# Altium footprint library con-amp.PCBLIB: 295 footprints (part 6 of 19)
Each footprint in its own frame and in the unit in brackets; x right, y up, seen from the top. Pads: shape width x height; smd on the part's side, far side on the other; paste and mask are expansions set on the pad; w line width, h text height; cw(c..) or ccw(c..) is an arc to the next point about the centre after c.
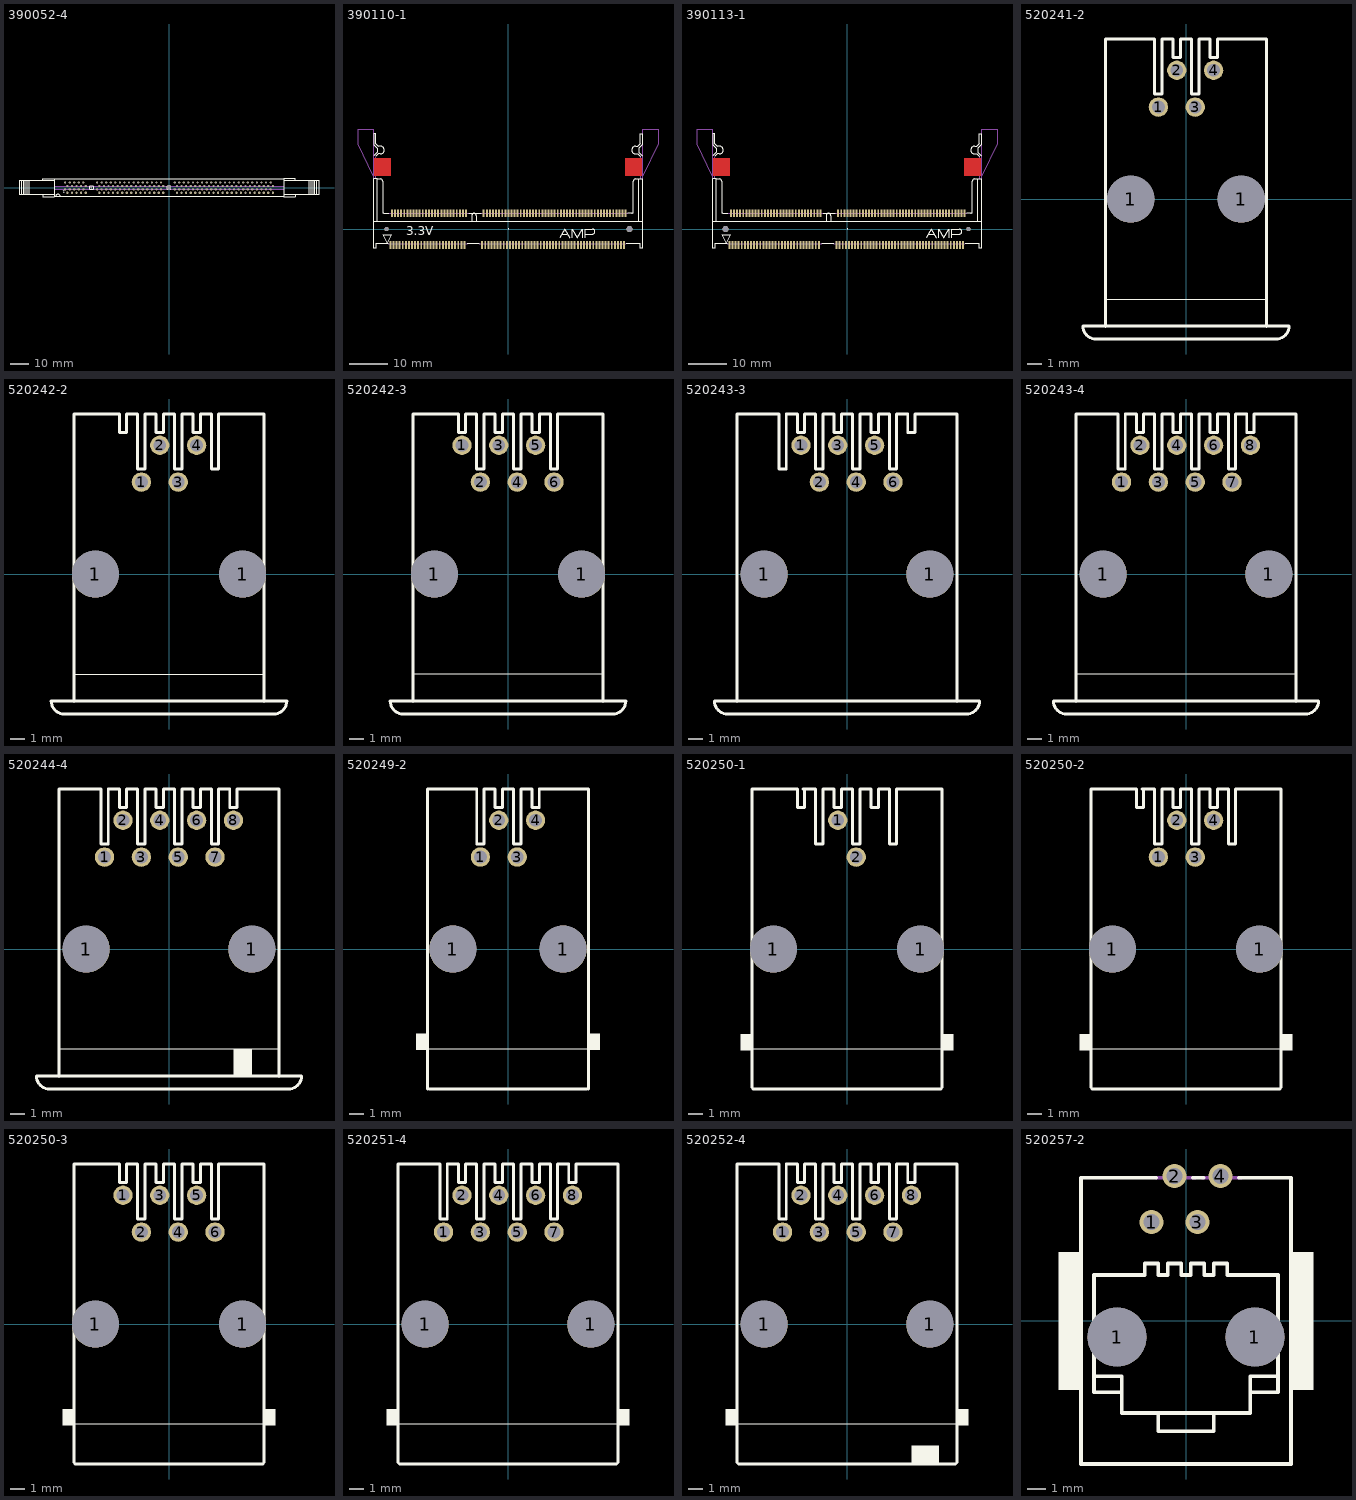
[diagram p5: the footprints below, top view; thin cyan lines are the x and y axes]

## 390052-4 [mil]
pads (170):
  rect 48x48 hole 32: 1(-2275,-37.5)
  round 32 hole 32: 1(-1700,0)
  round 93 hole 93: 1(0,0)
  oct 48x48 hole 32: 2(-2225,-112.5) 3(-2175,-37.5) 4(-2125,-112.5) 5(-2075,-37.5) 6(-2025,-112.5) 7(-1975,-37.5) 8(-1925,-112.5) 9(-1875,-37.5) 10(-1825,-112.5) 11(-1575,-37.5) 12(-1525,-112.5) 13(-1475,-37.5) 14(-1425,-112.5) 15(-1375,-37.5) 16(-1325,-112.5) 17(-1275,-37.5) 18(-1225,-112.5) 19(-1175,-37.5) 20(-1125,-112.5) 21(-1075,-37.5) 22(-1025,-112.5) 23(-975,-37.5) 24(-925,-112.5) 25(-875,-37.5) 26(-825,-112.5) 27(-775,-37.5) 28(-725,-112.5) 29(-675,-37.5) 30(-625,-112.5) 31(-575,-37.5) 32(-525,-112.5) 33(-475,-37.5) 34(-425,-112.5) 35(-375,-37.5) 36(-325,-112.5) 37(-275,-37.5) 38(-225,-112.5) 39(-175,-37.5) 40(-125,-112.5) 41(125,-37.5) 42(175,-112.5) 43(225,-37.5) 44(275,-112.5) 45(325,-37.5) 46(375,-112.5) 47(425,-37.5) 48(475,-112.5) 49(525,-37.5) 50(575,-112.5) 51(625,-37.5) 52(675,-112.5) 53(725,-37.5) 54(775,-112.5) 55(825,-37.5) 56(875,-112.5) 57(925,-37.5) 58(975,-112.5) 59(1025,-37.5) 60(1075,-112.5) 61(1125,-37.5) 62(1175,-112.5) 63(1225,-37.5) 64(1275,-112.5) 65(1325,-37.5) 66(1375,-112.5) 67(1425,-37.5) 68(1475,-112.5) 69(1525,-37.5) 70(1575,-112.5) 71(1625,-37.5) 72(1675,-112.5) 73(1725,-37.5) 74(1775,-112.5) 75(1825,-37.5) 76(1875,-112.5) 77(1925,-37.5) 78(1975,-112.5) 79(2025,-37.5) 80(2075,-112.5) 81(2125,-37.5) 82(2175,-112.5) 83(2225,-37.5) 84(2275,-112.5) 85(-2275,112.5) 86(-2225,37.5) 87(-2175,112.5) 88(-2125,37.5) 89(-2075,112.5) 90(-2025,37.5) 91(-1975,112.5) 92(-1925,37.5) 93(-1875,112.5) 94(-1825,37.5) 95(-1575,112.5) 96(-1525,37.5) 97(-1475,112.5) 98(-1425,37.5) 99(-1375,112.5) 100(-1325,37.5) 101(-1275,112.5) 102(-1225,37.5) 103(-1175,112.5) 104(-1125,37.5) 105(-1075,112.5) 106(-1025,37.5) 107(-975,112.5) 108(-925,37.5) 109(-875,112.5) 110(-825,37.5) 111(-775,112.5) 112(-725,37.5) 113(-675,112.5) 114(-625,37.5) 115(-575,112.5) 116(-525,37.5) 117(-475,112.5) 118(-425,37.5) 119(-375,112.5) 120(-325,37.5) 121(-275,112.5) 122(-225,37.5) 123(-175,112.5) 124(-125,37.5) 125(125,112.5) 126(175,37.5) 127(225,112.5) 128(275,37.5) 129(325,112.5) 130(375,37.5) 131(425,112.5) 132(475,37.5) 133(525,112.5) 134(575,37.5) 135(625,112.5) 136(675,37.5) 137(725,112.5) 138(775,37.5) 139(825,112.5) 140(875,37.5) 141(925,112.5) 142(975,37.5) 143(1025,112.5) 144(1075,37.5) 145(1125,112.5) 146(1175,37.5) 147(1225,112.5) 148(1275,37.5) 149(1325,112.5) 150(1375,37.5) 151(1425,112.5) 152(1475,37.5) 153(1525,112.5) 154(1575,37.5) 155(1625,112.5) 156(1675,37.5) 157(1725,112.5) 158(1775,37.5) 159(1825,112.5) 160(1875,37.5) 161(1925,112.5) 162(1975,37.5) 163(2025,112.5) 164(2075,37.5) 165(2125,112.5) 166(2175,37.5) 167(2225,112.5) 168(2275,37.5)
Top Overlay:
  lines w10: -2770,151 -2770,194 -2515,194 ; -2509,-194 2515,-194 ; -2485,-190 cw(c-2432.5,-200) -2380,-190 ; 2770,-151 2770,-194 2515,-194 ; -3240,-150 -3285,-150 -3285,150 -3240,150 ; -3240,-150 -3195,-150 ; -3240,-150 -3240,150 ; -3240,150 -3195,150 ; -3195,-150 -3155,-150 ; -3195,-150 -3195,150 ; -3195,150 -3155,150 ; -3155,-150 -3115,-150 ; -3155,-150 -3155,150 ; -3155,150 -3115,150 ; -3115,-150 -3075,-150 ; -3115,-150 -3115,150 ; -3115,150 -3075,150 ; -3075,-150 -2770,-150 ; -3075,-150 -3075,150 ; -3075,150 -2515,150 ; -2770,-150 -2770,-194 -2515,-194 -2515,-150 ; -2770,-150 -2515,-150 ; -2515,-150 -2515,150 ; -2515,150 -2515,194 ; -2515,194 2515,194 ; 2515,-194 2515,-150 ; 2515,-150 2515,150 ; 2515,-150 3075,-150 ; 2515,150 2515,194 ; 2515,150 2770,150 ; 2515,194 2770,194 2770,150 ; 2770,150 3075,150 ; 3075,-150 3115,-150 ; 3075,-150 3075,150 ; 3075,150 3115,150 ; 3115,-150 3155,-150 ; 3115,-150 3115,150 ; 3115,150 3155,150 ; 3155,-150 3195,-150 ; 3155,-150 3155,150 ; 3155,150 3195,150 ; 3195,-150 3240,-150 ; 3195,-150 3195,150 ; 3195,150 3240,150 ; 3240,-150 3285,-150 3285,150 3240,150 ; 3240,-150 3240,150 ; -1740,-34 -1740,34 -1660,34 -1660,-34 -1740,-34 ; -35,-34 -35,34 35,34 35,-34 -35,-34
  text "1" at -2325,-150 h108.5
Mechanical 16:
  lines w10: -2511,-34 2510,-34 ; -2511,34 2510,34

## 390110-1 [mm]
pads (146):
  round 1.1 hole 1.1: 1(-31.5,0)
  rect 0.5x2 smd: 1(-30.5,-4.1) 2(-29.7,-4.1) 3(-28.9,-4.1) 4(-28.1,-4.1) 5(-27.3,-4.1) 6(-26.5,-4.1) 7(-25.7,-4.1) 8(-24.9,-4.1) 9(-24.1,-4.1) 10(-23.3,-4.1) 11(-22.5,-4.1) 12(-21.7,-4.1) 13(-20.9,-4.1) 14(-20.1,-4.1) 15(-19.3,-4.1) 16(-18.5,-4.1) 17(-17.7,-4.1) 18(-16.9,-4.1) 19(-16.1,-4.1) 20(-15.3,-4.1) 21(-14.5,-4.1) 22(-13.7,-4.1) 23(-12.9,-4.1) 24(-12.1,-4.1) 25(-11.3,-4.1) 26(-6.7,-4.1) 27(-5.9,-4.1) 28(-5.1,-4.1) 29(-4.3,-4.1) 30(-3.5,-4.1) 31(-2.7,-4.1) 32(-1.9,-4.1) 33(-1.1,-4.1) 34(-0.3,-4.1) 35(0.5,-4.1) 36(1.3,-4.1) 37(2.1,-4.1) 38(2.9,-4.1) 39(3.7,-4.1) 40(4.5,-4.1) 41(5.3,-4.1) 42(6.1,-4.1) 43(6.9,-4.1) 44(7.7,-4.1) 45(8.5,-4.1) 46(9.3,-4.1) 47(10.1,-4.1) 48(10.9,-4.1) 49(11.7,-4.1) 50(12.5,-4.1) 51(13.3,-4.1) 52(14.1,-4.1) 53(14.9,-4.1) 54(15.7,-4.1) 55(16.5,-4.1) 56(17.3,-4.1) 57(18.1,-4.1) 58(18.9,-4.1) 59(19.7,-4.1) 60(20.5,-4.1) 61(21.3,-4.1) 62(22.1,-4.1) 63(22.9,-4.1) 64(23.7,-4.1) 65(24.5,-4.1) 66(25.3,-4.1) 67(26.1,-4.1) 68(26.9,-4.1) 69(27.7,-4.1) 70(28.5,-4.1) 71(29.3,-4.1) 72(30.1,-4.1) 73(-30.1,4.1) 74(-29.3,4.1) 75(-28.5,4.1) 76(-27.7,4.1) 77(-26.9,4.1) 78(-26.1,4.1) 79(-25.3,4.1) 80(-24.5,4.1) 81(-23.7,4.1) 82(-22.9,4.1) 83(-22.1,4.1) 84(-21.3,4.1) 85(-20.5,4.1) 86(-19.7,4.1) 87(-18.9,4.1) 88(-18.1,4.1) 89(-17.3,4.1) 90(-16.5,4.1) 91(-15.7,4.1) 92(-14.9,4.1) 93(-14.1,4.1) 94(-13.3,4.1) 95(-12.5,4.1) 96(-11.7,4.1) 97(-10.9,4.1) 98(-6.3,4.1) 99(-5.5,4.1) 100(-4.7,4.1) 101(-3.9,4.1) 102(-3.1,4.1) 103(-2.3,4.1) 104(-1.5,4.1) 105(-0.7,4.1) 106(0.1,4.1) 107(0.9,4.1) 108(1.7,4.1) 109(2.5,4.1) 110(3.3,4.1) 111(4.1,4.1) 112(4.9,4.1) 113(5.7,4.1) 114(6.5,4.1) 115(7.3,4.1) 116(8.1,4.1) 117(8.9,4.1) 118(9.7,4.1) 119(10.5,4.1) 120(11.3,4.1) 121(12.1,4.1) 122(12.9,4.1) 123(13.7,4.1) 124(14.5,4.1) 125(15.3,4.1) 126(16.1,4.1) 127(16.9,4.1) 128(17.7,4.1) 129(18.5,4.1) 130(19.3,4.1) 131(20.1,4.1) 132(20.9,4.1) 133(21.7,4.1) 134(22.5,4.1) 135(23.3,4.1) 136(24.1,4.1) 137(24.9,4.1) 138(25.7,4.1) 139(26.5,4.1) 140(27.3,4.1) 141(28.1,4.1) 142(28.9,4.1) 143(29.7,4.1) 144(30.5,4.1)
  round 1.6 hole 1.6: 1(31.5,0)
Top Layer:
  rectangle: -34.8,13.8 -30.3,18.4
  rectangle: 30.3,13.8 34.8,18.4
Top Overlay:
  region: 0,0 0.254,0 0.254,0.254 0,0.254
  lines w0.254: -34.8,19 -33.9,19.9 -33.9,21 -34.8,21.9 -34.8,24.7 -34.3,24.7 -34.3,22.1 -33.7,21.5 -33.1,21.5 cw(c-33.1,20.5) -33.1,19.5 -33.7,19.5 -34.3,18.9 ; -33.9,2.2 -33.9,13 ; -31.1,-3.8 -34.3,-3.8 -34.3,-5 -34.8,-5 -34.8,2.1 ; -30.9,4.1 -32.1,4.1 cw(c-32.1,4.5) -32.5,4.5 -32.5,12.4 ccw(c-33.1,12.4) -33.1,13 -33.9,13 ; -10.6,-3.8 -7.4,-3.8 ; -10.2,4.1 -7,4.1 ; -9.4,2.2 -9.4,3.5 cw(c-8.8,3.5) -8.2,3.5 -8.2,2.2 ; 30.7,-3.8 34.3,-3.8 34.3,-5 34.8,-5 34.8,2.1 ; 31.1,4.1 32.1,4.1 ccw(c32.1,4.5) 32.5,4.5 32.5,12.4 cw(c33.1,12.4) 33.1,13 33.9,13 ; 33.9,2.2 33.9,13 ; 34.3,18.9 33.7,19.5 33.1,19.5 cw(c33.1,20.5) 33.1,21.5 33.7,21.5 34.3,22.1 34.3,24.7 34.8,24.7 34.8,21.9 33.9,21 33.9,19.9 34.8,19 ; -34.8,2.1 -34.8,13 -33.9,13 ; -34.8,2.1 34.8,2.1 ; 33.9,13 34.8,13 34.8,2.1 ; -32.3,-1.5 -31.3,-3.6 -30.3,-1.5 -32.3,-1.5
  lines w0.305: 13.4,-2.3 14.7,0 16,-2.3 ; 14.1,-1.3 15.3,-1.3 ; 16.6,-2.3 16.6,0 17.9,-2.3 19.2,0 19.2,-2.3 ; 20,-2.3 20,0 ; 20.1,-1.3 21.9,-1.3 ccw(c21.9,-0.65) 21.9,0 20.1,0
  text "3.3V" at -26.4,-2.4 h3.94
Top Paste:
  rectangle: 30.775,14.025 34.55,18.2
  rectangle: -34.55,14.025 -30.775,18.2
Top Solder:
  rectangle: -34.9,13.725 -30.2,18.475
  rectangle: 30.225,13.725 34.925,18.475
Mechanical 13:
  region: 0,0 0.254,0 0.254,0.254 0,0.254
  region: 0,0 0.254,0 0.254,0.254 0,0.254
  lines w0.1: -38.9,22 -35,13.8 -35,25.9 -38.9,25.9 -38.9,22 ; 35,13.8 38.9,22.1 38.9,25.9 35,25.9 35,13.8
Mechanical 16:
  region: 0,0 0.254,0 0.254,0.254 0,0.254
  region: 0,0 0.254,0 0.254,0.254 0,0.254
  lines w0.254: -34.8,13 -34.8,19 ; -34.3,13 -34.3,18.8 ; -34.2,15.1 -34,15.1 cw(c-34,14.7) -33.6,14.7 ccw(c-33.2,14.7) -33.2,14.3 -31.6,14.3 ccw(c-31.6,14.7) -31.2,14.7 -31.2,17.5 ccw(c-31.6,17.5) -31.6,17.9 -33.2,17.9 ccw(c-33.2,17.5) -33.6,17.5 cw(c-34,17.5) -34,17.1 -34.2,17.1 ; -31.1,-3.8 -10.6,-3.8 ; -30.9,4.1 -10.2,4.1 ; -7.4,-3.8 30.6,-3.8 ; -7,4.1 31.1,4.1 ; 34.2,15.1 34,15.1 ccw(c34,14.7) 33.6,14.7 cw(c33.2,14.7) 33.2,14.3 31.6,14.3 cw(c31.6,14.7) 31.2,14.7 31.2,17.5 cw(c31.6,17.5) 31.6,17.9 33.2,17.9 cw(c33.2,17.5) 33.6,17.5 ccw(c34,17.5) 34,17.1 34.2,17.1 ; 34.3,13 34.3,18.9 ; 34.8,13 34.8,19 ; -34.1,15.2 -33.8,15.2 -33.4,14.8 -33.4,14.6 -33.3,14.5 -31.4,14.5 -31.4,17.7 -33.3,17.7 -33.5,17.5 -33.5,17.3 -33.9,16.9 -34.1,16.9 -34.1,15.2 ; 31.4,14.6 31.5,14.5 33.3,14.5 33.4,14.6 33.4,14.9 33.8,15.3 34.1,15.3 34.1,16.9 33.8,16.9 33.4,17.3 33.4,17.6 33.3,17.7 31.5,17.7 31.4,17.6 31.4,14.6

## 390113-1 [mm]
pads (146):
  round 1.6 hole 1.6: 1(-31.5,0)
  rect 0.5x2 smd: 1(-30.5,-4.1) 2(-29.7,-4.1) 3(-28.9,-4.1) 4(-28.1,-4.1) 5(-27.3,-4.1) 6(-26.5,-4.1) 7(-25.7,-4.1) 8(-24.9,-4.1) 9(-24.1,-4.1) 10(-23.3,-4.1) 11(-22.5,-4.1) 12(-21.7,-4.1) 13(-20.9,-4.1) 14(-20.1,-4.1) 15(-19.3,-4.1) 16(-18.5,-4.1) 17(-17.7,-4.1) 18(-16.9,-4.1) 19(-16.1,-4.1) 20(-15.3,-4.1) 21(-14.5,-4.1) 22(-13.7,-4.1) 23(-12.9,-4.1) 24(-12.1,-4.1) 25(-11.3,-4.1) 26(-10.5,-4.1) 27(-9.7,-4.1) 28(-8.9,-4.1) 29(-8.1,-4.1) 30(-7.3,-4.1) 31(-2.7,-4.1) 32(-1.9,-4.1) 33(-1.1,-4.1) 34(-0.3,-4.1) 35(0.5,-4.1) 36(1.3,-4.1) 37(2.1,-4.1) 38(2.9,-4.1) 39(3.7,-4.1) 40(4.5,-4.1) 41(5.3,-4.1) 42(6.1,-4.1) 43(6.9,-4.1) 44(7.7,-4.1) 45(8.5,-4.1) 46(9.3,-4.1) 47(10.1,-4.1) 48(10.9,-4.1) 49(11.7,-4.1) 50(12.5,-4.1) 51(13.3,-4.1) 52(14.1,-4.1) 53(14.9,-4.1) 54(15.7,-4.1) 55(16.5,-4.1) 56(17.3,-4.1) 57(18.1,-4.1) 58(18.9,-4.1) 59(19.7,-4.1) 60(20.5,-4.1) 61(21.3,-4.1) 62(22.1,-4.1) 63(22.9,-4.1) 64(23.7,-4.1) 65(24.5,-4.1) 66(25.3,-4.1) 67(26.1,-4.1) 68(26.9,-4.1) 69(27.7,-4.1) 70(28.5,-4.1) 71(29.3,-4.1) 72(30.1,-4.1) 73(-30.1,4.1) 74(-29.3,4.1) 75(-28.5,4.1) 76(-27.7,4.1) 77(-26.9,4.1) 78(-26.1,4.1) 79(-25.3,4.1) 80(-24.5,4.1) 81(-23.7,4.1) 82(-22.9,4.1) 83(-22.1,4.1) 84(-21.3,4.1) 85(-20.5,4.1) 86(-19.7,4.1) 87(-18.9,4.1) 88(-18.1,4.1) 89(-17.3,4.1) 90(-16.5,4.1) 91(-15.7,4.1) 92(-14.9,4.1) 93(-14.1,4.1) 94(-13.3,4.1) 95(-12.5,4.1) 96(-11.7,4.1) 97(-10.9,4.1) 98(-10.1,4.1) 99(-9.3,4.1) 100(-8.5,4.1) 101(-7.7,4.1) 102(-6.9,4.1) 103(-2.3,4.1) 104(-1.5,4.1) 105(-0.7,4.1) 106(0.1,4.1) 107(0.9,4.1) 108(1.7,4.1) 109(2.5,4.1) 110(3.3,4.1) 111(4.1,4.1) 112(4.9,4.1) 113(5.7,4.1) 114(6.5,4.1) 115(7.3,4.1) 116(8.1,4.1) 117(8.9,4.1) 118(9.7,4.1) 119(10.5,4.1) 120(11.3,4.1) 121(12.1,4.1) 122(12.9,4.1) 123(13.7,4.1) 124(14.5,4.1) 125(15.3,4.1) 126(16.1,4.1) 127(16.9,4.1) 128(17.7,4.1) 129(18.5,4.1) 130(19.3,4.1) 131(20.1,4.1) 132(20.9,4.1) 133(21.7,4.1) 134(22.5,4.1) 135(23.3,4.1) 136(24.1,4.1) 137(24.9,4.1) 138(25.7,4.1) 139(26.5,4.1) 140(27.3,4.1) 141(28.1,4.1) 142(28.9,4.1) 143(29.7,4.1) 144(30.5,4.1)
  round 1.1 hole 1.1: 1(31.5,0)
Top Layer:
  rectangle: -34.8,13.8 -30.3,18.4
  rectangle: 30.3,13.8 34.8,18.4
  rectangle: -34.8,13.8 -30.3,18.4
  rectangle: 30.3,13.8 34.8,18.4
Top Overlay:
  region: 0,0 0.254,0 0.254,0.254 0,0.254
  lines w0.254: -34.8,19 -33.9,19.9 -33.9,21 -34.8,21.9 -34.8,24.7 -34.3,24.7 -34.3,22.1 -33.7,21.5 -33.1,21.5 cw(c-33.1,20.5) -33.1,19.5 -33.7,19.5 -34.3,18.9 ; -33.9,2.2 -33.9,13 ; -31.1,-3.8 -34.3,-3.8 -34.3,-5 -34.8,-5 -34.8,2.1 ; -30.9,4.1 -32.1,4.1 cw(c-32.1,4.5) -32.5,4.5 -32.5,12.4 ccw(c-33.1,12.4) -33.1,13 -33.9,13 ; -6.6,-3.8 -3.4,-3.8 ; -6.2,4.1 -3,4.1 ; -5.4,2.2 -5.4,3.5 cw(c-4.8,3.5) -4.2,3.5 -4.2,2.2 ; 30.7,-3.8 34.3,-3.8 34.3,-5 34.8,-5 34.8,2.1 ; 31.1,4.1 32.1,4.1 ccw(c32.1,4.5) 32.5,4.5 32.5,12.4 cw(c33.1,12.4) 33.1,13 33.9,13 ; 33.9,2.2 33.9,13 ; 34.3,18.9 33.7,19.5 33.1,19.5 cw(c33.1,20.5) 33.1,21.5 33.7,21.5 34.3,22.1 34.3,24.7 34.8,24.7 34.8,21.9 33.9,21 33.9,19.9 34.8,19 ; -34.8,2.1 -34.8,13 -33.9,13 ; -34.8,2.1 34.8,2.1 ; 33.9,13 34.8,13 34.8,2.1 ; -32.3,-1.5 -31.3,-3.6 -30.3,-1.5 -32.3,-1.5
  lines w0.305: 20.6,-2.3 21.9,0 23.2,-2.3 ; 21.3,-1.3 22.5,-1.3 ; 23.8,-2.3 23.8,0 25.1,-2.3 26.4,0 26.4,-2.3 ; 27.2,-2.3 27.2,0 ; 27.3,-1.3 29.1,-1.3 ccw(c29.1,-0.65) 29.1,0 27.3,0
Top Paste:
  rectangle: 30.775,14.025 34.55,18.2
  rectangle: -34.55,14.025 -30.775,18.2
Top Solder:
  rectangle: -34.9,13.725 -30.2,18.475
  rectangle: 30.225,13.725 34.925,18.475
Mechanical 13:
  region: 0,0 0.254,0 0.254,0.254 0,0.254
  region: 0,0 0.254,0 0.254,0.254 0,0.254
  lines w0.1: -38.9,22 -35,13.8 -35,25.9 -38.9,25.9 -38.9,22 ; 35,13.8 38.9,22.1 38.9,25.9 35,25.9 35,13.8
Mechanical 16:
  region: 0,0 0.254,0 0.254,0.254 0,0.254
  region: 0,0 0.254,0 0.254,0.254 0,0.254
  lines w0.254: -34.8,13 -34.8,19 ; -34.3,13 -34.3,18.8 ; -34.2,15.1 -34,15.1 cw(c-34,14.7) -33.6,14.7 ccw(c-33.2,14.7) -33.2,14.3 -31.6,14.3 ccw(c-31.6,14.7) -31.2,14.7 -31.2,17.5 ccw(c-31.6,17.5) -31.6,17.9 -33.2,17.9 ccw(c-33.2,17.5) -33.6,17.5 cw(c-34,17.5) -34,17.1 -34.2,17.1 ; -31.1,-3.8 -6.6,-3.8 ; -30.9,4.1 -6.2,4.1 ; -3.4,-3.8 30.6,-3.8 ; -3,4.1 31.1,4.1 ; 34.2,15.1 34,15.1 ccw(c34,14.7) 33.6,14.7 cw(c33.2,14.7) 33.2,14.3 31.6,14.3 cw(c31.6,14.7) 31.2,14.7 31.2,17.5 cw(c31.6,17.5) 31.6,17.9 33.2,17.9 cw(c33.2,17.5) 33.6,17.5 ccw(c34,17.5) 34,17.1 34.2,17.1 ; 34.3,13 34.3,18.9 ; 34.8,13 34.8,19 ; -34.1,15.2 -33.8,15.2 -33.4,14.8 -33.4,14.6 -33.3,14.5 -31.4,14.5 -31.4,17.7 -33.3,17.7 -33.5,17.5 -33.5,17.3 -33.9,16.9 -34.1,16.9 -34.1,15.2 ; 31.4,14.6 31.5,14.5 33.3,14.5 33.4,14.6 33.4,14.9 33.8,15.3 34.1,15.3 34.1,16.9 33.8,16.9 33.4,17.3 33.4,17.6 33.3,17.7 31.5,17.7 31.4,17.6 31.4,14.6

## 520241-2 [mil]
pads (6):
  round 128 hole 128: 1(-150,0) 1(150,0)
  round 52.5 hole 35: 1(-75,250) 2(-25,350) 3(25,250) 4(75,350)
Top Overlay:
  lines w2: -217.5,-272.5 217.5,-272.5
  lines w8: -218.35,-345.51 -218.35,434.8 -85,434.8 ; -85,435 -85,434.8 ; 85,435 85,434.8 ; 218.35,-345.51 218.35,434.8 85,434.8 ; -85,434.8 -85,285 -65,285 -65,435 -35,435 -35,385 -15,385 -15,435 15,435 15,285 35,285 35,435 65,435 65,385 85,385 85,434.8 ; -280,-345 280,-345 cw(c245,-345) 245,-380 -245,-380 cw(c-245,-345) -280,-345

## 520242-2 [mil]
pads (6):
  round 128 hole 128: 1(-200,0) 1(200,0)
  round 52.5 hole 35: 1(-75,250) 2(-25,350) 3(25,250) 4(75,350)
Top Overlay:
  lines w2: -257.5,-272.5 257.5,-272.5
  lines w8: -258.35,-345.51 -258.35,434.8 ; -256.65,434.8 -135,435 -135,385 -115,385 -115,434.8 ; -115,435 -115,434.8 ; 115,434.8 85,434.8 85,385 65,385 65,435 35,435 35,285 15,285 15,435 -15,435 -15,385 -35,385 -35,435 -65,435 -65,285 -85,285 -85,434.8 -115,434.8 ; 115,435 115,285 135,285 135,435 256.65,434.8 ; 258.35,-345.51 258.35,434.8 ; -320,-345 320,-345 cw(c285,-345) 285,-380 -285,-380 cw(c-285,-345) -320,-345

## 520242-3 [mil]
pads (8):
  round 128 hole 128: 1(-200,0) 1(200,0)
  round 52.5 hole 35: 1(-125,350) 2(-75,250) 3(-25,350) 4(25,250) 5(75,350) 6(125,250)
Top Overlay:
  lines w2: -257.5,-272.5 257.5,-272.5
  lines w8: -258.35,-345.51 -258.35,434.8 -135,435 -135,385 -115,385 -115,434.8 ; -115,435 -115,434.8 ; -85,435 -85,434.8 ; 85,435 85,434.8 ; 115,434.8 85,434.8 ; 115,435 115,285 135,285 135,435 258.35,434.8 258.35,-345.51 ; -115,434.8 -85,434.8 ; -85,434.8 -85,285 -65,285 -65,435 -35,435 -35,385 -15,385 -15,435 15,435 15,285 35,285 35,435 65,435 65,385 85,385 85,434.8 ; -320,-345 320,-345 cw(c285,-345) 285,-380 -285,-380 cw(c-285,-345) -320,-345

## 520243-3 [mil]
pads (8):
  round 128 hole 128: 1(-225,0) 1(225,0)
  round 52.5 hole 35: 1(-125,350) 2(-75,250) 3(-25,350) 4(25,250) 5(75,350) 6(125,250)
Top Overlay:
  lines w8: -298.35,-345.51 -298.35,434.8 -185,435 -185,285 -165,285 -165,434.8 ; -165,435 -165,434.8 ; -135,435 -135,434.8 ; 35,435 35,434.8 ; 65,434.8 35,434.8 ; 65,435 65,385 85,385 85,435 115,435 115,285 135,285 135,434.8 ; 165,434.8 135,434.8 ; 185,435 185,434.8 ; 298.35,-345.51 298.35,434.8 185,434.8 ; -165,434.8 -135,434.8 ; -135,434.8 -135,385 -115,385 -115,435 -85,435 -85,285 -65,285 -65,435 -35,435 -35,385 -15,385 -15,435 15,435 15,285 35,285 35,434.8 ; 135,434.8 135,435 165,435 165,385 185,385 185,434.8 ; -360,-345 360,-345 cw(c325,-345) 325,-380 -325,-380 cw(c-325,-345) -360,-345

## 520243-4 [mil]
pads (10):
  round 128 hole 128: 1(-225,0) 1(225,0)
  round 52.5 hole 35: 1(-175,250) 2(-125,350) 3(-75,250) 4(-25,350) 5(25,250) 6(75,350) 7(125,250) 8(175,350)
Top Overlay:
  lines w2: -297.5,-272.5 297.5,-272.5
  lines w8: -298.35,-345.51 -298.35,434.8 -185,435 -185,285 -165,285 -165,434.8 ; -165,435 -165,434.8 ; -135,435 -135,434.8 ; 35,435 35,434.8 ; 65,434.8 35,434.8 ; 65,435 65,385 85,385 85,435 115,435 115,285 135,285 135,434.8 ; 165,434.8 135,434.8 ; 185,435 185,434.8 ; 298.35,-345.51 298.35,434.8 185,434.8 ; -165,434.8 -135,434.8 ; -135,434.8 -135,385 -115,385 -115,435 -85,435 -85,285 -65,285 -65,435 -35,435 -35,385 -15,385 -15,435 15,435 15,285 35,285 35,434.8 ; 135,434.8 135,435 165,435 165,385 185,385 185,434.8 ; -360,-345 360,-345 cw(c325,-345) 325,-380 -325,-380 cw(c-325,-345) -360,-345

## 520244-4 [mil]
pads (10):
  round 128 hole 128: 1(-225,0) 1(225,0)
  round 52.5 hole 35: 1(-175,250) 2(-125,350) 3(-75,250) 4(-25,350) 5(25,250) 6(75,350) 7(125,250) 8(175,350)
Top Overlay:
  rectangle: 175,-345 225,-270
  lines w2: -297.5,-272.5 297.5,-272.5
  lines w8: -298.35,-345.51 -298.35,434.8 -185,435 -185,285 -165,285 -165,434.8 ; -165,435 -165,434.8 ; -135,435 -135,434.8 ; 35,435 35,434.8 ; 65,434.8 35,434.8 ; 65,435 65,385 85,385 85,435 115,435 115,285 135,285 135,434.8 165,434.8 ; 135,435 165,435 165,385 185,385 185,434.8 ; 185,435 185,434.8 ; 298.35,-345.51 298.35,434.8 185,434.8 ; -165,434.8 -135,434.8 ; -135,434.8 -135,385 -115,385 -115,435 -85,435 -85,285 -65,285 -65,435 -35,435 -35,385 -15,385 -15,435 15,435 15,285 35,285 35,434.8 ; -360,-345 360,-345 cw(c325,-345) 325,-380 -325,-380 cw(c-325,-345) -360,-345

## 520249-2 [mil]
pads (6):
  round 128 hole 128: 1(-150,0) 1(150,0)
  round 52.5 hole 35: 1(-75,250) 2(-25,350) 3(25,250) 4(75,350)
Top Overlay:
  rectangle: 215,-275 250,-230
  rectangle: -250,-275 -220,-230
  lines w2: -217.5,-272.5 217.5,-272.5
  lines w8: -218.35,-380.51 -218.35,434.8 -85,434.8 ; -215,-380 215,-380 ; -85,435 -85,434.8 ; 85,435 85,434.8 ; 218.35,-380.51 218.35,434.8 85,434.8 ; -85,434.8 -85,285 -65,285 -65,435 -35,435 -35,385 -15,385 -15,435 15,435 15,285 35,285 35,435 65,435 65,385 85,385 85,434.8

## 520250-1 [mil]
pads (4):
  round 128 hole 128: 1(-200,0) 1(200,0)
  round 52.5 hole 35: 1(-25,350) 2(25,250)
Top Overlay:
  rectangle: 255,-275 290,-230
  rectangle: -290,-275 -260,-230
  lines w2: -257.5,-272.5 257.5,-272.5
  lines w8: -258.35,-375.51 -258.35,434.8 -135,435 -135,385 -115,385 -115,435 ; -255,-380 255,-380 ; -120,434.8 -85,434.8 ; -85,435 -85,434.8 ; 85,435 85,434.8 ; 115,434.8 85,434.8 ; 115,435 115,285 135,285 135,435 258.35,434.8 258.35,-375.51 ; -85,434.8 -85,285 -65,285 -65,435 -35,435 -35,385 -15,385 -15,435 15,435 15,285 35,285 35,435 65,435 65,385 85,385 85,434.8

## 520250-2 [mil]
pads (6):
  round 128 hole 128: 1(-200,0) 1(200,0)
  round 52.5 hole 35: 1(-75,250) 2(-25,350) 3(25,250) 4(75,350)
Top Overlay:
  rectangle: 260,-275 290,-230
  rectangle: -290,-275 -260,-230
  rectangle: 260,-275 290,-230
  lines w2: -257.5,-272.5 257.5,-272.5
  lines w8: -258.35,-375.51 -258.35,434.8 -135,435 -135,385 -115,385 -115,435 ; -255,-380 255,-380 ; -120,434.8 -85,434.8 ; -85,435 -85,434.8 ; 85,435 85,434.8 ; 115,434.8 85,434.8 ; 115,435 115,285 135,285 135,435 258.35,434.8 258.35,-375.51 ; -85,434.8 -85,285 -65,285 -65,435 -35,435 -35,385 -15,385 -15,435 15,435 15,285 35,285 35,435 65,435 65,385 85,385 85,434.8

## 520250-3 [mil]
pads (8):
  round 128 hole 128: 1(-200,0) 1(200,0)
  round 52.5 hole 35: 1(-125,350) 2(-75,250) 3(-25,350) 4(25,250) 5(75,350) 6(125,250)
Top Overlay:
  rectangle: 260,-275 290,-230
  rectangle: -290,-275 -260,-230
  lines w2: -257.5,-272.5 257.5,-272.5
  lines w8: -258.35,-375.51 -258.35,434.8 -135,435 -135,385 -115,385 -115,434.8 ; -255,-380 255,-380 ; -115,435 -115,434.8 ; -85,435 -85,434.8 ; 85,435 85,434.8 ; 115,434.8 85,434.8 ; 115,435 115,285 135,285 135,435 258.35,434.8 258.35,-375.51 ; -115,434.8 -85,434.8 ; -85,434.8 -85,285 -65,285 -65,435 -35,435 -35,385 -15,385 -15,435 15,435 15,285 35,285 35,435 65,435 65,385 85,385 85,434.8

## 520251-4 [mil]
pads (10):
  round 128 hole 128: 1(-225,0) 1(225,0)
  round 52.5 hole 35: 1(-175,250) 2(-125,350) 3(-75,250) 4(-25,350) 5(25,250) 6(75,350) 7(125,250) 8(175,350)
Top Overlay:
  rectangle: 300,-275 330,-230
  rectangle: -330,-275 -300,-230
  lines w2: -297.5,-272.5 297.5,-272.5
  lines w8: -298.35,-375.51 -298.35,434.8 -185,435 -185,285 -165,285 -165,434.8 ; -295,-380 295,-380 ; -165,435 -165,434.8 ; -135,435 -135,434.8 ; 35,435 35,434.8 ; 65,434.8 35,434.8 ; 65,435 65,385 85,385 85,435 115,435 115,285 135,285 135,434.8 165,434.8 ; 135,435 165,435 165,385 185,385 185,434.8 ; 185,435 185,434.8 ; 298.35,-375.51 298.35,434.8 185,434.8 ; -165,434.8 -135,434.8 ; -135,434.8 -135,385 -115,385 -115,435 -85,435 -85,285 -65,285 -65,435 -35,435 -35,385 -15,385 -15,435 15,435 15,285 35,285 35,434.8

## 520252-4 [mil]
pads (10):
  round 128 hole 128: 1(-225,0) 1(225,0)
  round 52.5 hole 35: 1(-175,250) 2(-125,350) 3(-75,250) 4(-25,350) 5(25,250) 6(75,350) 7(125,250) 8(175,350)
Top Overlay:
  rectangle: 300,-275 330,-230
  rectangle: -330,-275 -300,-230
  rectangle: 175,-380 250,-330
  lines w2: -297.5,-272.5 297.5,-272.5
  lines w8: -298.35,-375.51 -298.35,434.8 -185,435 -185,285 -165,285 -165,434.8 ; -295,-380 295,-380 ; -165,435 -165,434.8 ; 35,435 35,434.8 ; 65,434.8 35,434.8 ; 65,435 65,385 85,385 85,435 115,435 115,285 135,285 135,434.8 ; 165,434.8 135,434.8 ; 185,435 185,434.8 ; 298.35,-375.51 298.35,434.8 185,434.8 ; -165,434.8 -135,434.8 -135,385 -115,385 -115,435 -85,435 -85,285 -65,285 -65,435 -35,435 -35,385 -15,385 -15,435 15,435 15,285 35,285 35,434.8 ; 135,434.8 135,435 165,435 165,385 185,385 185,434.8

## 520257-2 [mil]
pads (6):
  round 128 hole 128: 1(-150,-35) 1(150,-35)
  round 52.5 hole 35: 1(-75,215) 2(-25,315) 3(25,215) 4(75,315)
Top Overlay:
  rectangle: -277.56,-149.61 -226.38,149.61
  rectangle: 226.38,-149.61 277.56,149.61
  lines w8: -65,311.02 -228.35,311.02 -228.35,-311.02 228.35,-311.02 228.35,311.02 115,311.02 ; 15,311.02 38.35,311.02 ; -200,-120 -200,100 -90,100 -90,125 -60,125 -60,100 -40,100 -40,125 -10,125 -10,100 10,100 10,125 40,125 40,100 60,100 60,125 90,125 90,100 200,100 200,-120 ; -200,-120 -200,-155 -140,-155 ; -200,-120 -140,-120 -140,-155 ; -140,-155 -140,-200 -60,-200 ; -60,-200 60,-200 ; -60,-200 -60,-240 60,-240 60,-200 ; 60,-200 140,-200 140,-155 ; 140,-155 200,-155 200,-120 ; 140,-155 140,-120 200,-120
Mechanical 16:
  lines w8: -65,311.02 20,311.02 ; 35,311.02 120,311.02